# Altium footprint library SoM_Artix.PcbLib: 239 footprints (part 5 of 15)
Each footprint in its own frame and in the unit in brackets; x right, y up, seen from the top. Pads: shape width x height; smd on the part's side, far side on the other; paste and mask are expansions set on the pad; w line width, h text height; cw(c..) or ccw(c..) is an arc to the next point about the centre after c.
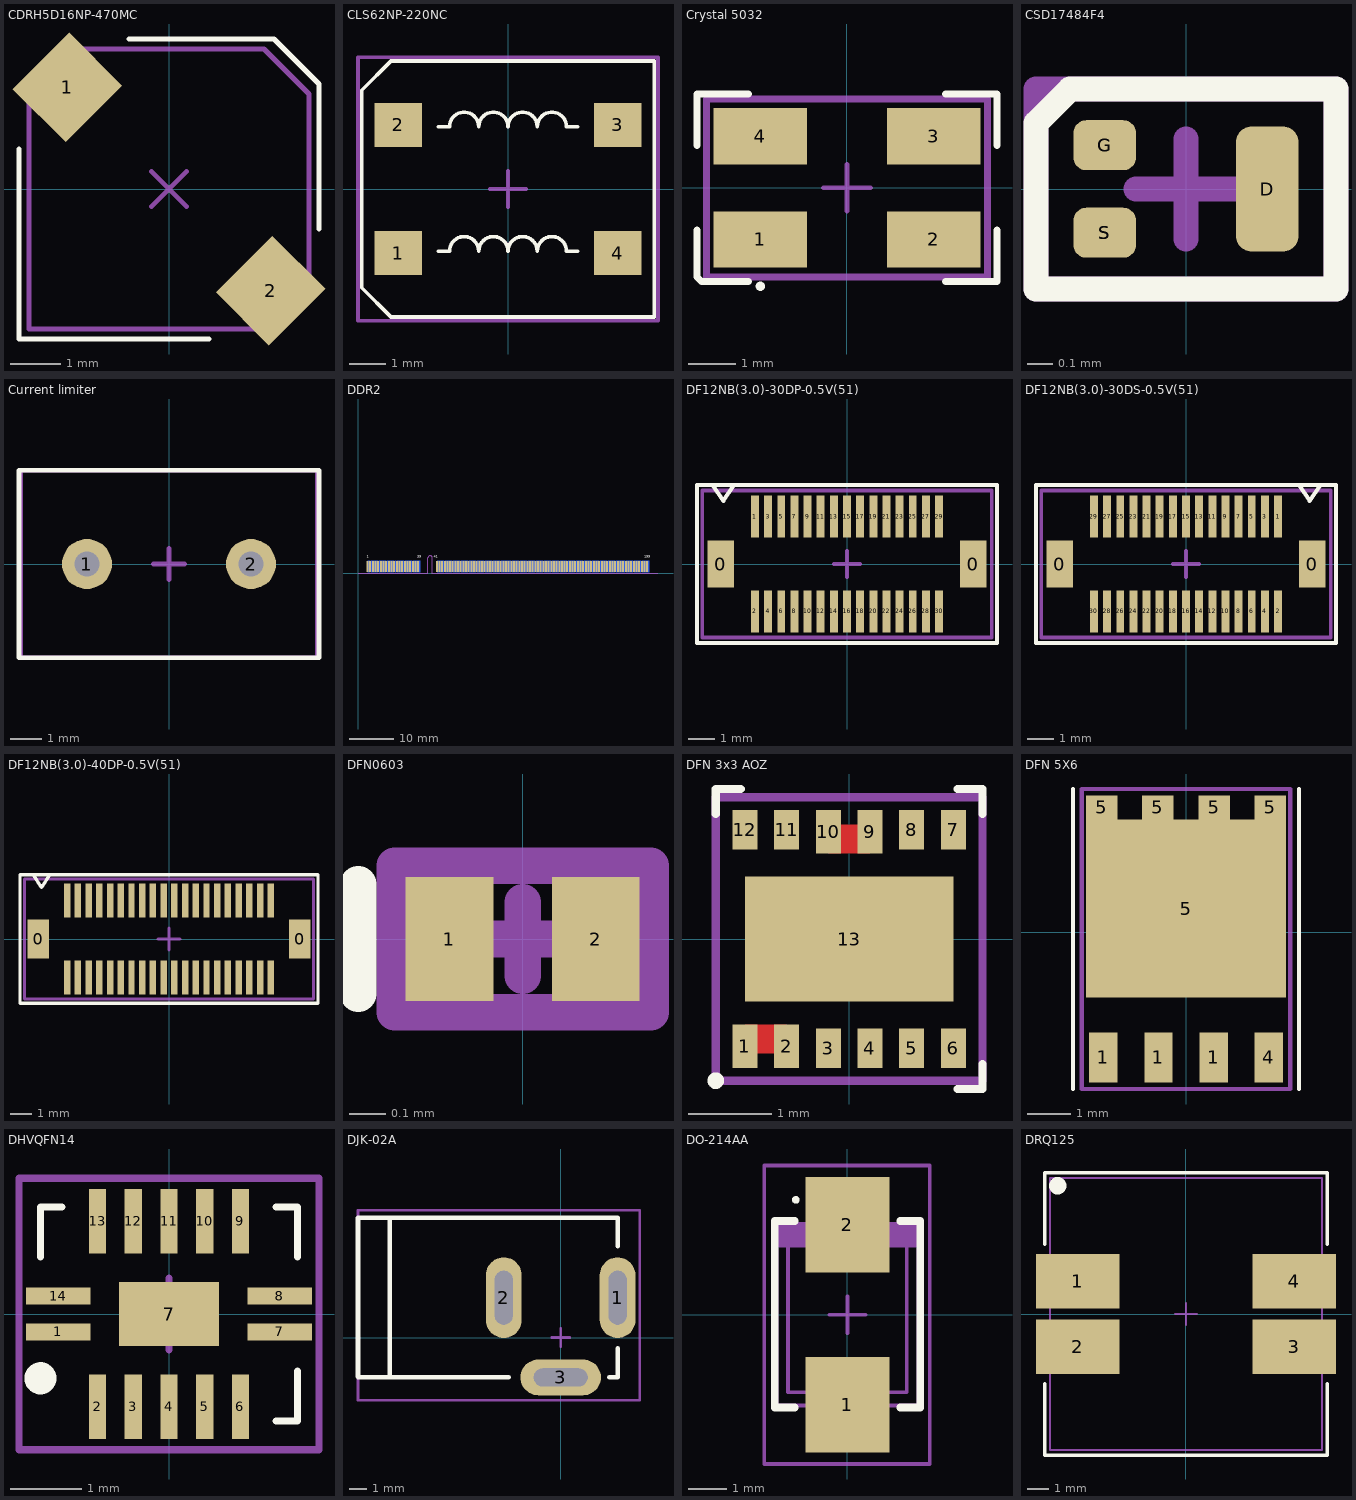
[diagram p4: the footprints below, top view; thin cyan lines are the x and y axes]

## CDRH5D16NP-470MC [mm]
height 1.8
pads (2):
  rect 1.5x1.6 smd rot 135: 1(-2.033,2.033) 2(2.033,-2.033)
Top Overlay:
  lines w0.1: -3,0.8 -3,-3 0.8,-3 ; -0.8,3 2.1,3 3,2.1 3,-0.8
Mechanical 13:
  lines w0.1: -0.354,-0.354 0.354,0.354 ; -0.354,0.354 0.354,-0.354 ; -2.8,-2.8 1.745,-2.8 2.8,-1.745 2.8,1.9 1.9,2.8 -2,2.8 -2.8,2 -2.8,-2.8
3D body "User Library-CDRH5D18.STEP": height 2, standoff 0, extent -3.005,-3 3,3

## CLS62NP-220NC [mm]
height 2.5
pads (4):
  rect 1.3x1.2 smd: 1(-3,-1.75) 2(-3,1.75) 3(3,1.75) 4(3,-1.75)
Top Overlay:
  lines w0.1: -1.9,-1.7 -1.6,-1.7 cw(c-1.2,-1.7) -0.8,-1.7 cw(c-0.4,-1.7) 0,-1.7 cw(c0.4,-1.7) 0.8,-1.7 cw(c1.2,-1.7) 1.6,-1.7 1.9,-1.7 ; -1.9,1.7 -1.6,1.7 cw(c-1.2,1.7) -0.8,1.7 cw(c-0.4,1.7) 0,1.7 cw(c0.4,1.7) 0.8,1.7 cw(c1.2,1.7) 1.6,1.7 1.9,1.7 ; -4,-2.7 -3.2,-3.5 4,-3.5 4,3.5 -3.2,3.5 -4,2.7 -4,-2.7
Mechanical 13:
  lines w0.1: -0.5,0 0.5,0 ; 0,-0.5 0,0.5 ; -4.1,-3.6 4.1,-3.6 4.1,3.6 -4.1,3.6 -4.1,-3.6
3D body: height 2.5, standoff 0, extent -4,-3.5 4,3.5

## Crystal 5032 [mm]
pads (4):
  rect 2x1.2 smd: 1(-1.85,-1.1) 2(1.85,-1.1) 3(1.85,1.1) 4(-1.85,1.1)
Top Overlay:
  circle w0.1: c-1.85,-2.1 r0.05
  lines w0.15: -3.2,-0.9 -3.2,-1.9 -3.1,-2 -2.1,-2 ; -3.2,0.9 -3.2,2 -2.1,2 ; 2.1,-2 3.2,-2 3.2,-0.9 ; 2.1,2 3.2,2 3.2,0.9
Mechanical 15:
  lines w0.1: -0.5,0 0.5,0 ; 0,-0.5 0,0.5
  lines w0.15: -3,-1.9 -3,1.9 3,1.9 3,-1.9 -3,-1.9
3D body "User Library-Crystal_SMD5032.step": height 0.85, standoff -0.01, extent -2.5,-1.6 2.443,1.6

## CSD17484F4 [mm]
pads (5):
  rrect50% 0.25x0.5 smd paste-0.03 mask+0: D(0.325,0)
  rrect50% 0.25x0.2 smd paste-0.04 mask+0.102: G(-0.325,0.175) S(-0.325,-0.175)
  rrect50% 0.25x0.15 on Top Solder paste-0.05 mask+0.05: G(-0.325,0.175) S(-0.325,-0.175)
Top Overlay:
  lines w0.1: -0.6,-0.4 -0.6,0.263 -0.463,0.4 0.6,0.4 0.6,-0.4 -0.6,-0.4
Mechanical 15:
  lines w0.1: -0.2,0 0.2,0 ; 0,-0.2 0,0.2 ; -0.6,-0.4 0.6,-0.4 0.6,0.4 -0.6,0.4 -0.6,-0.4
3D body "PICOSTAR3_YJJ_TEX.step": height 0.24, standoff 0, extent -0.521,-0.318 0.521,0.318

## Current limiter [mm]
height 14.5
pads (2):
  round 1.6 hole 0.8: 1(-2.625,0) 2(2.625,0)
Top Overlay:
  lines w0.15: -4.8,-3 4.8,-3 4.8,3 -4.8,3 -4.8,-3
Mechanical 13:
  lines w0.15: -0.5,0 0.5,0 ; 0,-0.5 0,0.5 ; -4.75,-3 4.75,-3 4.75,3 -4.75,3 -4.75,-3

## DDR2 [mm]
pads (200):
  rect 0.45x2.55 smd: 1(2.15,1.575) 3(2.75,1.575) 5(3.35,1.575) 7(3.95,1.575) 9(4.55,1.575) 11(5.15,1.575) 13(5.75,1.575) 15(6.35,1.575) 17(6.95,1.575) 19(7.55,1.575) 21(8.15,1.575) 23(8.75,1.575) 25(9.35,1.575) 27(9.95,1.575) 29(10.55,1.575) 31(11.15,1.575) 33(11.75,1.575) 35(12.35,1.575) 37(12.95,1.575) 39(13.55,1.575) 41(17.75,1.575) 43(18.35,1.575) 45(18.95,1.575) 47(19.55,1.575) 49(20.15,1.575) 51(20.75,1.575) 53(21.35,1.575) 55(21.95,1.575) 57(22.55,1.575) 59(23.15,1.575) 61(23.75,1.575) 63(24.35,1.575) 65(24.95,1.575) 67(25.55,1.575) 69(26.15,1.575) 71(26.75,1.575) 73(27.35,1.575) 75(27.95,1.575) 77(28.55,1.575) 79(29.15,1.575) 81(29.75,1.575) 83(30.35,1.575) 85(30.95,1.575) 87(31.55,1.575) 89(32.15,1.575) 91(32.75,1.575) 93(33.35,1.575) 95(33.95,1.575) 97(34.55,1.575) 99(35.15,1.575) 101(35.75,1.575) 103(36.35,1.575) 105(36.95,1.575) 107(37.55,1.575) 109(38.15,1.575) 111(38.75,1.575) 113(39.35,1.575) 115(39.95,1.575) 117(40.55,1.575) 119(41.15,1.575) 121(41.75,1.575) 123(42.35,1.575) 125(42.95,1.575) 127(43.55,1.575) 129(44.15,1.575) 131(44.75,1.575) 133(45.35,1.575) 135(45.95,1.575) 137(46.55,1.575) 139(47.15,1.575) 141(47.75,1.575) 143(48.35,1.575) 145(48.95,1.575) 147(49.55,1.575) 149(50.15,1.575) 151(50.75,1.575) 153(51.35,1.575) 155(51.95,1.575) 157(52.55,1.575) 159(53.15,1.575) 161(53.75,1.575) 163(54.35,1.575) 165(54.95,1.575) 167(55.55,1.575) 169(56.15,1.575) 171(56.75,1.575) 173(57.35,1.575) 175(57.95,1.575) 177(58.55,1.575) 179(59.15,1.575) 181(59.75,1.575) 183(60.35,1.575) 185(60.95,1.575) 187(61.55,1.575) 189(62.15,1.575) 191(62.75,1.575) 193(63.35,1.575) 195(63.95,1.575) 197(64.55,1.575) 199(65.15,1.575)
  rect 0.45x2.55 smd far side: 2(2.45,1.575) 4(3.05,1.575) 6(3.65,1.575) 8(4.25,1.575) 10(4.85,1.575) 12(5.45,1.575) 14(6.05,1.575) 16(6.65,1.575) 18(7.25,1.575) 20(7.85,1.575) 22(8.45,1.575) 24(9.05,1.575) 26(9.65,1.575) 28(10.25,1.575) 30(10.85,1.575) 32(11.45,1.575) 34(12.05,1.575) 36(12.65,1.575) 38(13.25,1.575) 40(13.85,1.575) 42(18.05,1.575) 44(18.65,1.575) 46(19.25,1.575) 48(19.85,1.575) 50(20.45,1.575) 52(21.05,1.575) 54(21.65,1.575) 56(22.25,1.575) 58(22.85,1.575) 60(23.45,1.575) 62(24.05,1.575) 64(24.65,1.575) 66(25.25,1.575) 68(25.85,1.575) 70(26.45,1.575) 72(27.05,1.575) 74(27.65,1.575) 76(28.25,1.575) 78(28.85,1.575) 80(29.45,1.575) 82(30.05,1.575) 84(30.65,1.575) 86(31.25,1.575) 88(31.85,1.575) 90(32.45,1.575) 92(33.05,1.575) 94(33.65,1.575) 96(34.25,1.575) 98(34.85,1.575) 100(35.45,1.575) 102(36.05,1.575) 104(36.65,1.575) 106(37.25,1.575) 108(37.85,1.575) 110(38.45,1.575) 112(39.05,1.575) 114(39.65,1.575) 116(40.25,1.575) 118(40.85,1.575) 120(41.45,1.575) 122(42.05,1.575) 124(42.65,1.575) 126(43.25,1.575) 128(43.85,1.575) 130(44.45,1.575) 132(45.05,1.575) 134(45.65,1.575) 136(46.25,1.575) 138(46.85,1.575) 140(47.45,1.575) 142(48.05,1.575) 144(48.65,1.575) 146(49.25,1.575) 148(49.85,1.575) 150(50.45,1.575) 152(51.05,1.575) 154(51.65,1.575) 156(52.25,1.575) 158(52.85,1.575) 160(53.45,1.575) 162(54.05,1.575) 164(54.65,1.575) 166(55.25,1.575) 168(55.85,1.575) 170(56.45,1.575) 172(57.05,1.575) 174(57.65,1.575) 176(58.25,1.575) 178(58.85,1.575) 180(59.45,1.575) 182(60.05,1.575) 184(60.65,1.575) 186(61.25,1.575) 188(61.85,1.575) 190(62.45,1.575) 192(63.05,1.575) 194(63.65,1.575) 196(64.25,1.575) 198(64.85,1.575) 200(65.45,1.575)
Top Overlay:
  text "1" at 1.95,3.275 h1
  text "39" at 13.35,3.275 h1
  text "41" at 17.05,3.275 h1
  text "199" at 64.55,3.275 h1
Bottom Overlay:
  text "2" at 2.25,3.275 h1
  text "40" at 13.45,3.275 h1
  text "42" at 17.55,3.275 h1
  text "200" at 64.95,3.275 h1
Mechanical 15:
  lines w0.1: 0,0 15.75,0 15.75,3.5 cw(c16.25,3.5) 16.75,3.5 16.75,0 67.6,0

## DF12NB(3.0)-30DP-0.5V(51) [mm]
pads (32):
  rect 1x1.8 smd: 0(-4.8,0) 0(4.8,0)
  rect 0.3x1.6 smd: 1(-3.5,1.8) 2(-3.5,-1.8) 3(-3,1.8) 4(-3,-1.8) 5(-2.5,1.8) 6(-2.5,-1.8) 7(-2,1.8) 8(-2,-1.8) 9(-1.5,1.8) 10(-1.5,-1.8) 11(-1,1.8) 12(-1,-1.8) 13(-0.5,1.8) 14(-0.5,-1.8) 15(0,1.8) 16(0,-1.8) 17(0.5,1.8) 18(0.5,-1.8) 19(1,1.8) 20(1,-1.8) 21(1.5,1.8) 22(1.5,-1.8) 23(2,1.8) 24(2,-1.8) 25(2.5,1.8) 26(2.5,-1.8) 27(3,1.8) 28(3,-1.8) 29(3.5,1.8) 30(3.5,-1.8)
Top Overlay:
  lines w0.15: -5.1,3 -4.7,2.4 -4.3,3 ; -5.7,-3 -5.7,3 5.7,3 5.7,-3 -5.7,-3
Mechanical 13:
  lines w0.15: -0.5,0 0.5,0 ; 0,-0.5 0,0.5 ; -5.5,-2.8 5.5,-2.8 5.5,2.8 -5.5,2.8 -5.5,-2.8
3D body "DF12NB(3.0)-30DP.stp": height 2.3, standoff 0, extent -5.3,-2.3 5.3,2.3

## DF12NB(3.0)-30DS-0.5V(51) [mm]
pads (32):
  rect 1x1.8 smd: 0(-4.8,0) 0(4.8,0)
  rect 0.3x1.6 smd: 1(3.5,1.8) 2(3.5,-1.8) 3(3,1.8) 4(3,-1.8) 5(2.5,1.8) 6(2.5,-1.8) 7(2,1.8) 8(2,-1.8) 9(1.5,1.8) 10(1.5,-1.8) 11(1,1.8) 12(1,-1.8) 13(0.5,1.8) 14(0.5,-1.8) 15(0,1.8) 16(0,-1.8) 17(-0.5,1.8) 18(-0.5,-1.8) 19(-1,1.8) 20(-1,-1.8) 21(-1.5,1.8) 22(-1.5,-1.8) 23(-2,1.8) 24(-2,-1.8) 25(-2.5,1.8) 26(-2.5,-1.8) 27(-3,1.8) 28(-3,-1.8) 29(-3.5,1.8) 30(-3.5,-1.8)
Top Overlay:
  lines w0.15: 4.3,3 4.7,2.4 5.1,3 ; -5.7,-3 5.7,-3 5.7,3 -5.7,3 -5.7,-3
Mechanical 13:
  lines w0.15: -0.5,0 0.5,0 ; 0,-0.5 0,0.5 ; -5.5,-2.8 -5.5,2.8 5.5,2.8 5.5,-2.8 -5.5,-2.8
3D body "DF12NB(3.0)-30DS.stp": height 2.2, standoff 0, extent -5.3,-2.3 5.3,2.3

## DF12NB(3.0)-40DP-0.5V(51) [mm]
pads (42):
  rect 1x1.8 smd: 0(-6.1,0) 0(6.1,0)
  rect 0.3x1.6 smd: 1(-4.75,1.8) 2(-4.75,-1.8) 3(-4.25,1.8) 4(-4.25,-1.8) 5(-3.75,1.8) 6(-3.75,-1.8) 7(-3.25,1.8) 8(-3.25,-1.8) 9(-2.75,1.8) 10(-2.75,-1.8) 11(-2.25,1.8) 12(-2.25,-1.8) 13(-1.75,1.8) 14(-1.75,-1.8) 15(-1.25,1.8) 16(-1.25,-1.8) 17(-0.75,1.8) 18(-0.75,-1.8) 19(-0.25,1.8) 20(-0.25,-1.8) 21(0.25,1.8) 22(0.25,-1.8) 23(0.75,1.8) 24(0.75,-1.8) 25(1.25,1.8) 26(1.25,-1.8) 27(1.75,1.8) 28(1.75,-1.8) 29(2.25,1.8) 30(2.25,-1.8) 31(2.75,1.8) 32(2.75,-1.8) 33(3.25,1.8) 34(3.25,-1.8) 35(3.75,1.8) 36(3.75,-1.8) 37(4.25,1.8) 38(4.25,-1.8) 39(4.75,1.8) 40(4.75,-1.8)
Top Overlay:
  lines w0.15: -6.35,3 -5.95,2.4 -5.55,3 ; -6.95,-3 6.95,-3 6.95,3 -6.95,3 -6.95,-3
Mechanical 13:
  lines w0.15: -0.5,0 0.5,0 ; 0,-0.5 0,0.5 ; -6.75,-2.8 -6.75,2.8 6.75,2.8 6.75,-2.8 -6.75,-2.8
3D body "DF12NB(3.0)-40DP.stp": height 2.3, standoff 0, extent -6.55,-2.3 6.55,2.3

## DFN0603 [mm]
pads (2):
  rect 0.24x0.34 smd mask+0.03: 1(-0.2,0) 2(0.2,0)
Top Overlay:
  lines w0.1: -0.45,-0.15 -0.45,0.15
Mechanical 15:
  lines w0.1: -0.1,0 0.1,0 ; 0,-0.1 0,0.1 ; -0.35,-0.2 0.35,-0.2 0.35,0.2 -0.35,0.2 -0.35,-0.2
3D body "User Library-DIODFM152A.step": height 0.34, standoff 0, extent -0.33,-0.18 0.33,0.18

## DFN 3x3 AOZ [mm]
pads (13):
  rect 0.3x0.525 smd mask+0.05: 1(-1.25,-1.287) 2(-0.75,-1.287) 9(0.25,1.288) 10(-0.25,1.288)
  rect 0.3x0.475 smd mask+0.05: 3(-0.25,-1.312) 4(0.25,-1.312) 5(0.75,-1.312) 6(1.25,-1.312) 7(1.25,1.313) 8(0.75,1.313) 11(-0.75,1.313) 12(-1.25,1.313)
  rect 2.5x1.5 smd mask+0.05: 13(0,0)
Top Layer:
  rectangle: -1.25,-1.374 -0.75,-1.025
  region: 0.25,1.374 -0.25,1.374 -0.25,1.026 0.25,1.026
Top Overlay:
  circle w0.1: c-1.6,-1.7 r0.05
  lines w0.1: -1.6,1.5 -1.6,1.8 -1.3,1.8 ; 1.3,-1.8 1.6,-1.8 1.6,-1.5 ; 1.3,1.8 1.6,1.8 1.6,1.5
Top Solder:
  rectangle: -1.306,-1.425 -0.758,-0.975
  region: 0.306,1.425 -0.242,1.425 -0.242,0.975 0.306,0.975
Mechanical 15:
  lines w0.1: -0.5,0 0.5,0 ; 0,-0.5 0,0.5 ; -1.6,-1.7 -1.6,1.7 1.6,1.7 1.6,-1.7 -1.6,-1.7
3D body "User Library-DFN-12-3x3-0_5.STEP": height 0.8, standoff 0, extent -1.5,-1.56 1.5,1.56

## DFN 5X6 [mm]
pads (9):
  rect 0.65x1.15 smd mask+0.05: 1(-1.905,-2.875) 1(-0.635,-2.875) 1(0.635,-2.875) 4(1.905,-2.875)
  rect 0.725x0.55 smd mask+0.05: 5(-1.937,2.875) 5(-0.646,2.875) 5(0.646,2.875) 5(1.937,2.875)
  rect 4.6x4.1 smd mask+0.05: 5(0,0.55)
Top Overlay:
  lines w0.1: -2.6,-3.6 -2.6,3.3 ; 2.6,-3.6 2.6,3.3
Top Solder:
  region: -2.33,0.2 -2.53,0.2 -2.53,-0.2 -2.33,-0.2
  rectangle: 2.33,-0.2 2.53,0.2
Mechanical 15:
  lines w0.1: -0.5,0 0.5,0 ; 0,-0.5 0,0.5 ; -2.4,-3.6 2.4,-3.6 2.4,3.3 -2.4,3.3 -2.4,-3.6
3D body "User Library-Power_Flat_5x6.step": height 0.95, standoff -0.04, extent -2.6,-3.175 2.6,2.975

## DHVQFN14 [mm]
pads (15):
  rect 0.9x0.24 smd paste-0.02 mask+0.05: 1(-1.55,-0.25) 7(1.55,-0.25) 8(1.55,0.25) 14(-1.55,0.25)
  rect 0.24x0.9 smd paste-0.02 mask+0.05: 2(-1,-1.3) 3(-0.5,-1.3) 4(0,-1.3) 5(0.5,-1.3) 6(1,-1.3) 9(1,1.3) 10(0.5,1.3) 11(0,1.3) 12(-0.5,1.3) 13(-1,1.3)
  rect 1.4x0.9 smd paste-2539.97 mask+0.05: 7(0,0)
Top Overlay:
  circle w0.25: c-1.8,-0.9 r0.1
  lines w0.1: -1.8,0.8 -1.8,1.5 -1.5,1.5 ; 1.5,-1.5 1.8,-1.5 1.8,-0.8 ; 1.5,1.5 1.8,1.5 1.8,0.8
Top Paste:
  region: -0.3,0.2 -0.3,-0.2 0.3,-0.2 0.3,0.2
Top Solder:
  region: 1.805,-0.078 1.049,-0.078 1.049,-0.422 1.805,-0.422
  region: 1.805,0.422 1.049,0.422 1.049,0.078 1.805,0.078
  rectangle: -1.805,-0.422 -1.049,-0.078
  rectangle: -1.805,0.078 -1.049,0.422
Mechanical 15:
  lines w0.1: -0.5,0 0.5,0 ; 0,-0.5 0,0.5 ; -2.1,-1.9 -2.1,1.9 2.1,1.9 2.1,-1.9 -2.1,-1.9
3D body "User Library-DHVQFN 14.step": height 0.85, standoff -0.02, extent -1.501,-1.251 1.501,1.251

## DJK-02A [mm]
pads (3):
  oval 2x4.5 hole 1 slot 3 at 90 deg: 1(3.175,2.222) 2(-3.175,2.222)
  oval 4.5x2 hole 1 slot 3 at 0 deg: 3(0,-2.222)
Top Overlay:
  lines w0.25: -11.303,-2.2 -2.9,-2.2 ; 2.7,-2.2 3.175,-2.2 3.175,-0.6 ; 3.175,5.1 3.175,6.693
  lines w0.254: -11.303,-2.197 -11.303,6.693 3.175,6.693 ; -9.525,-2.095 -9.525,6.54
Mechanical 15:
  lines w0.15: -0.5,0 0.5,0 ; 0,-0.5 0,0.5 ; -11.3,-3.5 -11.3,7.1 4.4,7.1 4.4,-3.5 -11.3,-3.5
3D body "User Library-DC_Power.STEP": height 11, standoff -3.5, extent -10.832,-2.4 3.568,6.9

## DO-214AA [mm]
pads (2):
  rect 2.2x2.5 smd: 1(0,-2.35) 2(0,2.35)
Top Overlay:
  circle w0.1: c-1.35,3 r0.05
  lines w0.2: -1.375,-2.425 -1.9,-2.425 -1.9,2.45 -1.375,2.45 ; 1.375,-2.425 1.9,-2.425 1.9,2.45 1.375,2.45
Mechanical 1:
  lines w0.1: -1.55,2.025 -1.55,-2.025 1.55,-2.025 1.55,2.025
Mechanical 13:
  region: 1.85,1.75 1.85,2.425 -1.85,2.425 -1.85,1.75
  lines w0.1: -1.85,2.375 -1.85,-2.375 1.85,-2.375 1.85,2.375
Mechanical 15:
  lines w0.1: -0.475,0 0.475,0 ; 0,-0.475 0,0.475 ; -2.175,-3.9 2.15,-3.9 2.15,3.9 -2.175,3.9 -2.175,-3.9
3D body "SMB.STEP": height 2.4, standoff 0, extent -1.9,-2.8 1.9,2.8

## DRQ125 [mm] "Coil"
height 6
pads (4):
  rect 3.85x2.5 smd: 1(-4.975,1.5) 2(-4.975,-1.5) 3(4.975,-1.5) 4(4.975,1.5)
Top Overlay:
  circle w0.5: c-5.9,5.9 r0.15
  lines w0.15: -6.5,-3.2 -6.5,-6.5 6.5,-6.5 6.5,-3.2 ; -6.5,3.2 -6.5,6.5 6.5,6.5 6.5,3.2
Mechanical 13:
  lines w0.1: -0.5,0 0.5,0 ; 0,-0.5 0,0.5 ; -6.25,-6.25 -6.25,6.25 6.25,6.25 6.25,-6.25 -6.25,-6.25
3D body "User Library-DRQ127_12_5x12_5.step": height 8, standoff 0, extent -6.25,-6.25 6.25,6.25